# Altium footprint library IntegratedPcbLib.PcbLib: 81 footprints (part 1 of 6)
Each footprint in its own frame and in the unit in brackets; x right, y up, seen from the top. Pads: shape width x height; smd on the part's side, far side on the other; paste and mask are expansions set on the pad; w line width, h text height; cw(c..) or ccw(c..) is an arc to the next point about the centre after c.
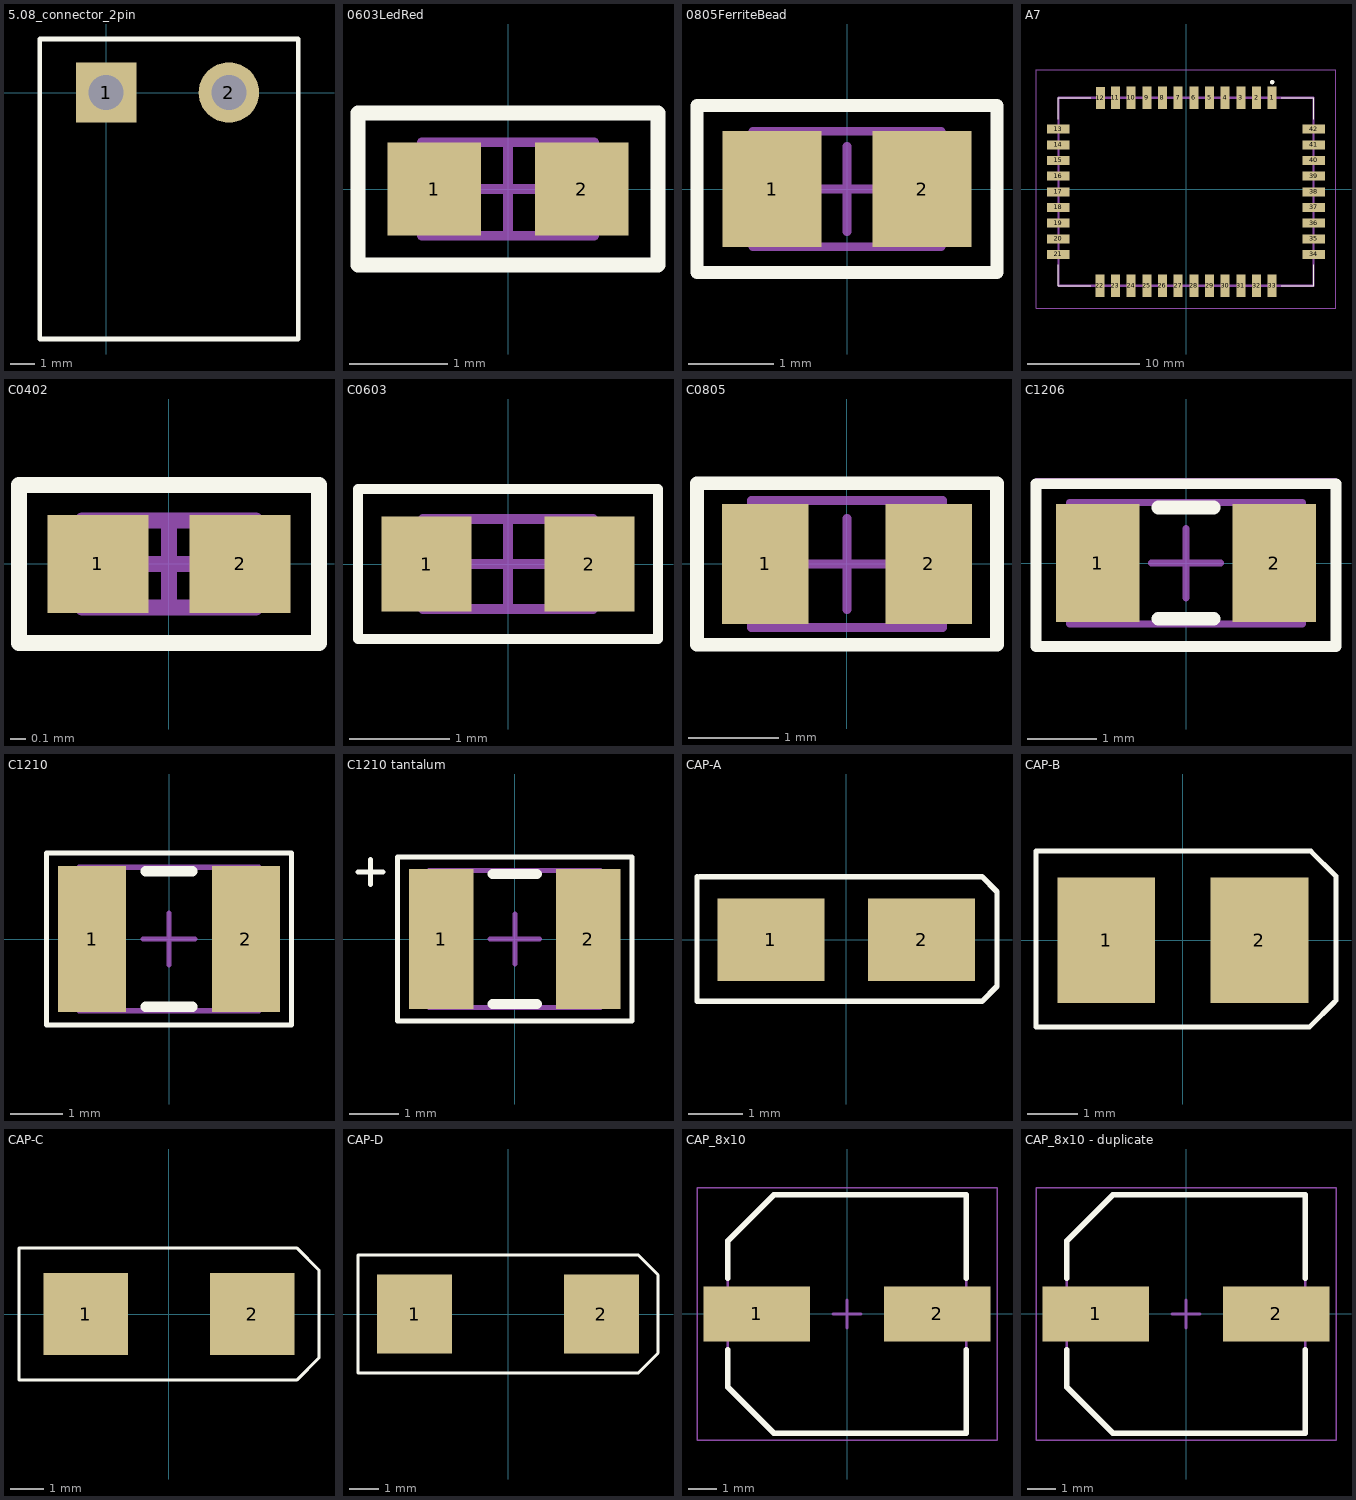
[diagram p0: the footprints below, top view; thin cyan lines are the x and y axes]

## 5.08_connector_2pin [mm] "Connector; Header; 3 Position"
pads (2):
  rect 2.5x2.5 hole 1.45: 1(0,0)
  round 2.5 hole 1.45: 2(5.08,0)
Top Overlay:
  lines w0.2: -2.75,-10.2 7.95,-10.2 7.95,2.215 -2.75,2.215 -2.75,-10.2
3D body "User Library-MSTB 2,5-2-G-5,08 1770711.STEP": height 8.6, standoff -3.5, extent -2.475,-10.026 7.685,1.976

## 0603LedRed [mm] "Chip Led 2-Leads, Body 1,60x0,85mm, IPC Medium Density"
height 0.55
pads (2):
  rect 0.95x0.95 smd: 1(-0.75,0) 2(0.75,0)
Top Overlay:
  lines w0.152: -1.525,-0.775 -1.525,0.775 1.525,0.775 1.525,-0.775 -1.525,-0.775
Mechanical 13:
  lines w0.1: -0.875,-0.475 0.875,-0.475 0.875,0.475 -0.875,0.475 -0.875,-0.475
Mechanical 15:
  lines w0.05: -1.525,-0.775 1.525,-0.775 1.525,0.775 -1.525,0.775 -1.525,-0.775
  lines w0.1: -0.475,0 0.475,0 ; 0,-0.475 0,0.475
3D body: height 0.3, standoff -0.3, extent -0.45,-1.1 -0.45,-1.1
3D body "User Library-LTST-C190EKT.STEP": height 0.9, standoff 0, extent -0.85,-0.45 0.85,0.45

## 0805FerriteBead [mm] "Chip Ferrite Bead, 2-Leads, Body 2,00x1,25mm, IPC Medium Density"
height 0.7
pads (2):
  rect 1.15x1.35 smd: 1(-0.875,0) 2(0.875,0)
Top Overlay:
  lines w0.152: -1.75,-0.975 1.75,-0.975 1.75,0.975 -1.75,0.975 -1.75,-0.975
Mechanical 13:
  lines w0.1: -1.1,-0.675 -1.1,0.675 1.1,0.675 1.1,-0.675 -1.1,-0.675
Mechanical 15:
  lines w0.05: -1.75,-0.975 -1.75,0.925 1.75,0.925 1.75,-0.975 -1.75,-0.975
  lines w0.1: -0.5,0 0.5,0 ; 0,-0.5 0,0.5
3D body "User Library-ind_0805.step": height 0.92, standoff -0.03, extent -1,-0.6 1,0.6

## A7 [mm]
pads (42):
  rect 0.8x2 smd: 1(7.7,8.15) 2(6.3,8.15) 3(4.9,8.15) 4(3.5,8.15) 5(2.1,8.15) 6(0.7,8.15) 7(-0.7,8.15) 8(-2.1,8.15) 9(-3.5,8.15) 10(-4.9,8.15) 11(-6.3,8.15) 12(-7.65,8.125) 22(-7.7,-8.65) 23(-6.3,-8.65) 24(-4.9,-8.65) 25(-3.5,-8.65) 26(-2.1,-8.65) 27(-0.7,-8.65) 28(0.7,-8.65) 29(2.1,-8.65) 30(3.5,-8.65) 31(4.9,-8.65) 32(6.3,-8.65) 33(7.7,-8.65)
  rect 2x0.8 smd: 13(-11.4,5.35) 14(-11.4,3.95) 15(-11.4,2.55) 16(-11.4,1.15) 17(-11.4,-0.25) 18(-11.4,-1.65) 19(-11.4,-3.05) 20(-11.4,-4.45) 21(-11.4,-5.85) 34(11.4,-5.85) 35(11.4,-4.45) 36(11.4,-3.05) 37(11.4,-1.65) 38(11.4,-0.25) 39(11.4,1.15) 40(11.4,2.55) 41(11.4,3.95) 42(11.4,5.35)
Top Overlay:
  lines w0.1: -11.4,-6.75 -11.4,-8.65 -8.5,-8.65 ; -11.4,6.25 -11.4,8.15 -8.5,8.15 ; 8.5,-8.65 11.4,-8.65 11.4,-6.75 ; 8.5,8.15 11.4,8.15 11.4,6.25
  lines w0.2: 7.6,9.55 ccw(c7.7,9.55) 7.8,9.55 ccw(c7.7,9.55) 7.6,9.55
Mechanical 13:
  lines w0.2: -11.4,-8.65 -11.4,8.15 11.4,8.15 11.4,-8.65 -11.4,-8.65
Mechanical 15:
  lines w0.1: -13.4,-10.65 -13.4,10.65 13.4,10.65 13.4,-10.65 -13.4,-10.65
3D body "User Library-GSM A6-1.step": height 3.21, standoff 0, extent -11.375,-8.65 11.425,8.15

## C0402 [mm] "Chip Capacitor, 2-Leads, Body 1,00x0,50mm, IPC Medium Density"
height 0.4
pads (2):
  rect 0.64x0.62 smd: 1(-0.45,0) 2(0.45,0)
Top Overlay:
  lines w0.1: -0.95,-0.5 -0.95,0.5 0.95,0.5 0.95,-0.5 -0.95,-0.5
Mechanical 13:
  lines w0.1: -0.55,-0.275 -0.55,0.275 0.55,0.275 0.55,-0.275 -0.55,-0.275
Mechanical 15:
  lines w0.1: -0.275,0 0.275,0 ; 0,-0.275 0,0.275
3D body "CAPC1005X04N.step": height 0.4, standoff 0, extent -0.55,-0.275 0.55,0.275

## C0603 [mm] "Chip Capacitor, 2-Leads, Body 1,60x0,80mm, IPC Medium Density"
height 0.5
pads (2):
  rect 0.9x0.95 smd: 1(-0.813,0) 2(0.813,0)
Top Overlay:
  lines w0.1: -1.5,-0.75 -1.5,0.75 1.5,0.75 1.5,-0.75 -1.5,-0.75
Mechanical 13:
  lines w0.1: -0.85,-0.45 0.85,-0.45 0.85,0.45 -0.85,0.45 -0.85,-0.45
Mechanical 15:
  lines w0.1: -0.45,0 0.45,0 ; 0,-0.45 0,0.45
3D body "CAPC1608X05N.step": height 0.5, standoff 0, extent -0.85,-0.45 0.85,0.45

## C0805 [mm] "Chip Capacitor, 2-Leads, Body 2,00x1,27mm, IPC Medium Density"
height 1.45
pads (2):
  rect 0.948x1.323 smd: 1(-0.9,0) 2(0.9,0)
Top Overlay:
  lines w0.152: -1.651,-0.889 -1.651,0.889 1.651,0.889 1.651,-0.889 -1.651,-0.889
Mechanical 13:
  lines w0.1: -1.05,-0.7 1.05,-0.7 1.05,0.7 -1.05,0.7 -1.05,-0.7
Mechanical 15:
  lines w0.1: -0.5,0 0.5,0 ; 0,-0.5 0,0.5
3D body "User Library-0805 SMD Capacitor.step": height 0.71, standoff -0.07, extent -1,-0.625 1,0.625

## C1206 [mm] "Chip Capacitor, 2-Leads, Body 3,20x1,60mm, IPC Medium Density"
height 2
pads (2):
  rect 1.2x1.7 smd: 1(-1.27,0) 2(1.27,0)
Top Overlay:
  lines w0.152: -2.159,-1.2 2.159,-1.2 2.159,1.143 -2.159,1.143 -2.159,-1.2
  lines w0.2: -0.4,-0.8 0.4,-0.8 ; -0.4,0.8 0.4,0.8
Mechanical 13:
  lines w0.1: -1.675,-0.875 1.675,-0.875 1.675,0.875 -1.675,0.875 -1.675,-0.875
Mechanical 15:
  lines w0.05: -2.159,-1.225 -2.159,1.2 2.159,1.2 2.159,-1.225 -2.159,-1.225
  lines w0.1: -0.5,0 0.5,0 ; 0,-0.5 0,0.5
3D body: height 0.63, standoff -0.63, extent 0,-1.75 0,-1.75
3D body "User Library-1206 SMD Capacitor.step": height 1, standoff 0, extent -1.6,-0.8 1.6,0.8

## C1210 [mm] "Chip Capacitor, 2-Leads, Body 3,28x2,60mm, IPC Medium Density"
height 1
pads (2):
  rect 1.3x2.8 smd: 1(-1.475,0) 2(1.475,0)
Top Overlay:
  lines w0.1: -2.35,-1.65 2.35,-1.65 2.35,1.65 -2.35,1.65 -2.35,-1.65
  lines w0.2: -0.45,-1.3 0.45,-1.3 ; -0.45,1.3 0.45,1.3
Mechanical 13:
  lines w0.1: -1.725,-1.375 1.725,-1.375 1.725,1.375 -1.725,1.375 -1.725,-1.375
Mechanical 15:
  lines w0.1: -0.5,0 0.5,0 ; 0,-0.5 0,0.5
3D body "CAPC3326X10N.step": height 1, standoff 0, extent -1.725,-1.375 1.725,1.375

## C1210 tantalum [mm] "Chip Capacitor, 2-Leads, Body 3,28x2,60mm, IPC Medium Density"
height 1
pads (2):
  rect 1.3x2.8 smd: 1(-1.475,0) 2(1.475,0)
Top Overlay:
  lines w0.1: -3.146,1.346 -2.646,1.346 ; -2.896,1.092 -2.896,1.592 ; -2.35,-1.65 -2.35,1.65 2.35,1.65 2.35,-1.65 -2.35,-1.65
  lines w0.2: -0.45,-1.3 0.45,-1.3 ; -0.45,1.3 0.45,1.3
Mechanical 13:
  lines w0.1: -1.725,-1.375 -1.725,1.375 1.725,1.375 1.725,-1.375 -1.725,-1.375
Mechanical 15:
  lines w0.1: -0.5,0 0.5,0 ; 0,-0.5 0,0.5
3D body "CAPC3326X10N.step": height 1, standoff 0, extent -1.725,-1.375 1.725,1.375

## CAP-A [mm]
pads (2):
  rect 1.95x1.5 smd: 1(-1.375,0) 2(1.375,0)
Top Overlay:
  lines w0.1: -2.725,1.15 -2.725,0.025 -2.725,-1.125 2.475,-1.125 2.75,-0.85 2.75,0.875 2.475,1.15 -2.675,1.15
3D body "User Library-AVX_ACASE.step": height 1.71, standoff 0, extent -1.7,-0.84 1.7,0.84

## CAP-B [mm]
pads (2):
  rect 1.95x2.5 smd: 1(-1.525,0) 2(1.525,0)
Top Overlay:
  lines w0.1: 3.02,-1.23 2.525,-1.725 -2.925,-1.725 -2.925,0.175 -2.925,1.775 2.55,1.775 3.045,1.28 ; 3.05,-1.2 3.05,1.275
3D body "User Library-AVX_BCASE.step": height 2.03, standoff 0, extent -1.85,-1.465 1.85,1.465

## CAP-C [mm]
pads (2):
  rect 2.55x2.5 smd: 1(-2.525,0) 2(2.525,0)
Top Overlay:
  lines w0.1: -4.55,-2 3.883,-2 4.55,-1.333 4.55,1.333 3.883,2 -4.55,2 -4.55,0 -4.55,-2
3D body "User Library-AVX_C_CASE.step": height 2.7, standoff 0, extent -3.05,-1.675 3.05,1.675

## CAP-D [mm]
pads (2):
  rect 2.55x2.7 smd: 1(-3.175,0) 2(3.175,0)
Top Overlay:
  lines w0.1: -5.1,-2 4.433,-2 5.1,-1.333 5.1,1.333 4.433,2 -5.1,2 -5.1,0 -5.1,-2
3D body "User Library-AVX_D_CASE.step": height 3.01, standoff 0, extent -3.7,-2.225 3.7,2.225

## CAP_8x10 [mm] "Aluminum Electrolytic Capacitor, Body 8,30x8,30x10,50mm, IPC High Density"
height 10.5
pads (2):
  rect 3.8x1.95 smd: 1(-3.225,0) 2(3.225,0)
Top Overlay:
  lines w0.2: -4.25,-1.275 -4.25,-2.613 -2.612,-4.25 4.25,-4.25 4.25,-1.275 ; -4.25,1.275 -4.25,2.612 -2.612,4.25 4.25,4.25 4.25,1.275
Mechanical 13:
  lines w0.1: -4.25,-2.613 -2.612,-4.25 4.25,-4.25 4.25,4.25 -2.612,4.25 -4.25,2.612 -4.25,-2.613
Mechanical 15:
  lines w0.05: -5.35,-4.5 -5.35,4.5 5.35,4.5 5.35,-4.5 -5.35,-4.5
  lines w0.1: -0.5,0 0.5,0 ; 0,-0.5 0,0.5
3D body "User Library-AL_EL_cap_8mmx10mm.STEP": height 10.3, standoff -0.2, extent -4.852,-4.25 4.848,4.25

## CAP_8x10 - duplicate [mm] "Aluminum Electrolytic Capacitor, Body 8,30x8,30x10,50mm, IPC High Density"
height 10.5
pads (2):
  rect 3.8x1.95 smd: 1(-3.225,0) 2(3.225,0)
Top Overlay:
  lines w0.2: -4.25,-1.275 -4.25,-2.613 -2.612,-4.25 4.25,-4.25 4.25,-1.275 ; -4.25,1.275 -4.25,2.612 -2.612,4.25 4.25,4.25 4.25,1.275
Mechanical 13:
  lines w0.1: -4.25,-2.613 -4.25,2.612 -2.612,4.25 4.25,4.25 4.25,-4.25 -2.612,-4.25 -4.25,-2.613
Mechanical 15:
  lines w0.05: -5.35,-4.5 5.35,-4.5 5.35,4.5 -5.35,4.5 -5.35,-4.5
  lines w0.1: -0.5,0 0.5,0 ; 0,-0.5 0,0.5
3D body "User Library-AL_EL_cap_8mmx10mm.STEP": height 10.3, standoff -0.2, extent -4.852,-4.25 4.848,4.25